# Altium footprint library hphonglib.PcbLib: 703 footprints (part 24 of 44)
Each footprint in its own frame and in the unit in brackets; x right, y up, seen from the top. Pads: shape width x height; smd on the part's side, far side on the other; paste and mask are expansions set on the pad; w line width, h text height; cw(c..) or ccw(c..) is an arc to the next point about the centre after c.
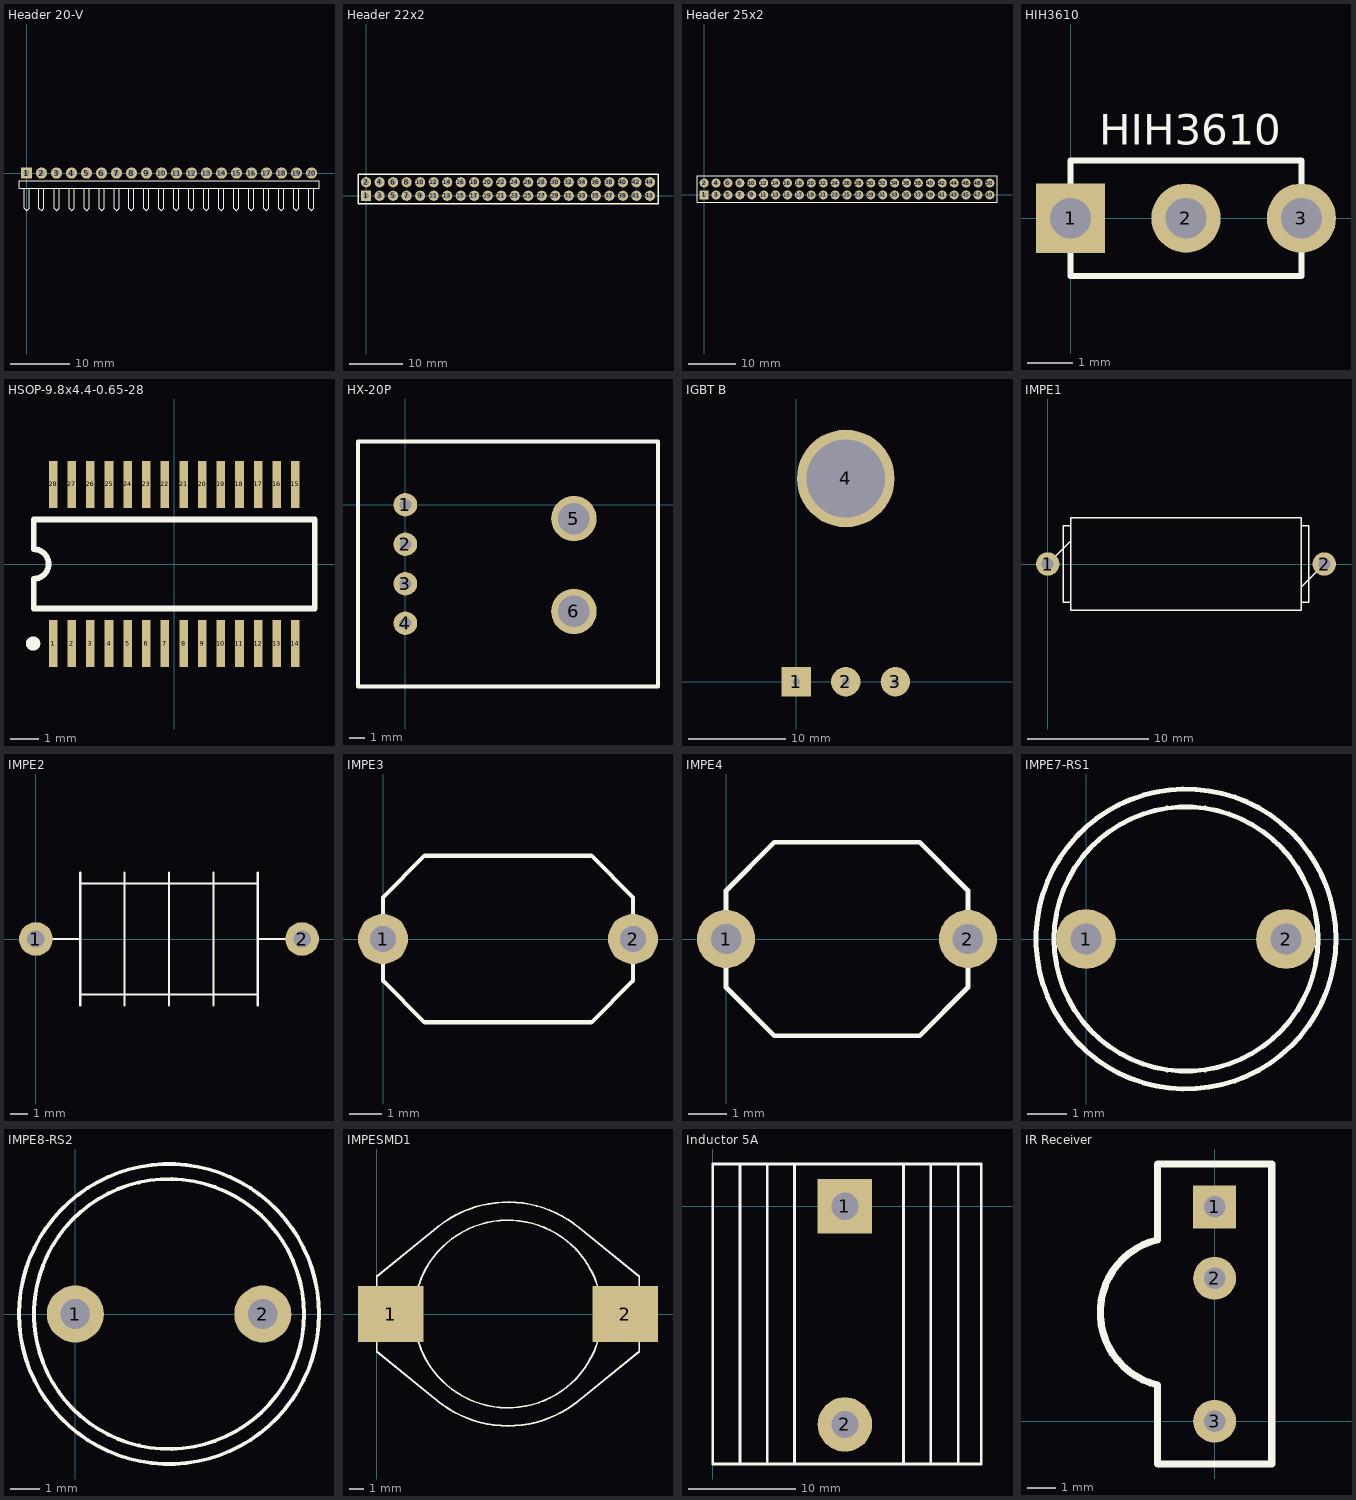
[diagram p23: the footprints below, top view; thin cyan lines are the x and y axes]

## Header 20-V [mil] "Connector; Header; 20 Position; Vertical; Solder Pad 35mil"
pads (20):
  rect 75x75 hole 40: 1(0,0)
  round 75 hole 40: 2(100,0) 3(200,0) 4(300,0) 5(400,0) 6(500,0) 7(600,0) 8(700,0) 9(800,0) 10(900,0) 11(1000,0) 12(1100,0) 13(1200,0) 14(1300,0) 15(1400,0) 16(1500,0) 17(1600,0) 18(1700,0) 19(1800,0) 20(1900,0)
Top Overlay:
  lines w7.87: -16.67,-100 -16.67,-233.33 0,-250 16.67,-233.33 16.67,-100 ; 83.33,-100 83.33,-233.33 100,-250 116.67,-233.33 116.67,-100 ; 183.33,-100 183.33,-233.33 200,-250 216.67,-233.33 216.67,-100 ; 283.33,-100 283.33,-233.33 300,-250 316.67,-233.33 316.67,-100 ; 383.33,-100 383.33,-233.33 400,-250 416.67,-233.33 416.67,-100 ; 483.33,-100 483.33,-233.33 500,-250 516.67,-233.33 516.67,-100 ; 583.33,-100 583.33,-233.33 600,-250 616.67,-233.33 616.67,-100 ; 683.33,-100 683.33,-233.33 700,-250 716.66,-233.33 716.66,-100 ; 783.33,-100 783.33,-233.33 800,-250 816.66,-233.33 816.66,-100 ; 883.33,-100 883.33,-233.33 900,-250 916.66,-233.33 916.66,-100 ; 983.33,-100 983.33,-233.33 1000,-250 1016.66,-233.33 1016.66,-100 ; 1083.33,-100 1083.33,-233.33 1100,-250 1116.66,-233.33 1116.66,-100 ; 1183.33,-100 1183.33,-233.33 1200,-250 1216.66,-233.33 1216.66,-100 ; 1283.33,-100 1283.33,-233.33 1300,-250 1316.66,-233.33 1316.66,-100 ; 1383.33,-100 1383.33,-233.33 1400,-250 1416.66,-233.33 1416.66,-100 ; 1483.33,-99.99 1483.33,-233.33 1499.99,-249.99 1516.66,-233.33 1516.66,-99.99 ; 1583.33,-99.99 1583.33,-233.33 1599.99,-249.99 1616.66,-233.33 1616.66,-99.99 ; 1683.33,-99.99 1683.33,-233.33 1699.99,-249.99 1716.66,-233.33 1716.66,-99.99 ; 1783.33,-99.99 1783.33,-233.33 1799.99,-249.99 1816.66,-233.33 1816.66,-99.99 ; 1883.33,-99.99 1883.33,-233.33 1899.99,-249.99 1916.66,-233.33 1916.66,-99.99 ; -50,-100 -50,-50 1950,-50 1950,-100 -50,-100
3D body: height 171.28, standoff -117.11, extent -50,-275.59 1950,50

## Header 22x2 [mil] "Connector; Header; 44 Position; 2 Rows; Solder Pad 35mil"
pads (44):
  rect 75x75 hole 40: 1(0,0)
  round 75 hole 40: 2(0,100) 3(100,0) 4(100,100) 5(200,0) 6(200,100) 7(300,0) 8(300,100) 9(400,0) 10(400,100) 11(500,0) 12(500,100) 13(600,0) 14(600,100) 15(700,0) 16(700,100) 17(800,0) 18(800,100) 19(900,0) 20(900,100) 21(1000,0) 22(1000,100) 23(1100,0) 24(1100,100) 25(1200,0) 26(1200,100) 27(1300,0) 28(1300,100) 29(1400,0) 30(1400,100) 31(1500,0) 32(1500,100) 33(1600,0) 34(1600,100) 35(1700,0) 36(1700,100) 37(1800,0) 38(1800,100) 39(1900,0) 40(1900,100) 41(2000,0) 42(2000,100) 43(2100,0) 44(2100,100)
Top Overlay:
  lines w10: -60,-60 -60,160 2160,160 2160,-60 -60,-60
3D body: height 330, standoff -100, extent -49.99,-49.99 2150.01,150.01

## Header 25x2 [mil] "Connector; Header; 50 Position; 2 Rows; Solder Pad 35mil"
pads (50):
  rect 75x75 hole 40: 1(0,0)
  round 75 hole 40: 2(0,100) 3(100,0) 4(100,100) 5(200,0) 6(200,100) 7(300,0) 8(300,100) 9(400,0) 10(400,100) 11(500,0) 12(500,100) 13(600,0) 14(600,100) 15(700,0) 16(700,100) 17(800,0) 18(800,100) 19(900,0) 20(900,100) 21(1000,0) 22(1000,100) 23(1100,0) 24(1100,100) 25(1200,0) 26(1200,100) 27(1300,0) 28(1300,100) 29(1400,0) 30(1400,100) 31(1500,0) 32(1500,100) 33(1600,0) 34(1600,100) 35(1700,0) 36(1700,100) 37(1800,0) 38(1800,100) 39(1900,0) 40(1900,100) 41(2000,0) 42(2000,100) 43(2100,0) 44(2100,100) 45(2200,0) 46(2200,100) 47(2300,0) 48(2300,100) 49(2400,0) 50(2400,100)
Top Overlay:
  lines w10: -60,-60 2460,-60 2460,160 -60,160 -60,-60
3D body: height 330, standoff -100, extent -50,-50 2450,150

## HIH3610 [mil]
pads (3):
  rect 60x60 hole 35.43: 1(0,0)
  round 60 hole 35.43: 2(100,0) 3(200,0)
Top Overlay:
  lines w5: 0,-50 200,-50 200,50 0,50 0,-50
  text "HIH3610" at 25,55 h45.6

## HSOP-9.8x4.4-0.65-28 [mm] "Small Outline Pakage; 28 Leads; Body 4.4 mm; Pitch 0.65 mm; Heatsink"
height 1.2
pads (28):
  rect 0.3x1.65 smd: 1(-4.225,-2.775) 2(-3.575,-2.775) 3(-2.925,-2.775) 4(-2.275,-2.775) 5(-1.625,-2.775) 6(-0.975,-2.775) 7(-0.325,-2.775) 8(0.325,-2.775) 9(0.975,-2.775) 10(1.625,-2.775) 11(2.275,-2.775) 12(2.925,-2.775) 13(3.575,-2.775) 14(4.225,-2.775) 15(4.225,2.775) 16(3.575,2.775) 17(2.925,2.775) 18(2.275,2.775) 19(1.625,2.775) 20(0.975,2.775) 21(0.325,2.775) 22(-0.325,2.775) 23(-0.975,2.775) 24(-1.625,2.775) 25(-2.275,2.775) 26(-2.925,2.775) 27(-3.575,2.775) 28(-4.225,2.775)
Top Overlay:
  circle w0.25: c-4.925,-2.775 r0.125
  lines w0.2: -4.9,-1.55 -4.9,-0.517 ccw(c-4.9,0) -4.9,0.517 -4.9,1.55 4.9,1.55 4.9,-1.55 -4.9,-1.55
3D body: height 1.35, standoff 0, extent -4.9,-3.228 4.9,3.228

## HX-20P [mil] "Current Transducer HX Series; 3-25A"
pads (6):
  round 60 hole 30: 1(0,0) 2(0,-100) 3(0,-200) 4(0,-300)
  round 115 hole 80: 5(427,-35) 6(427,-270)
Top Overlay:
  lines w10: -120,-460 -120,160 640,160 640,-460 -120,-460
3D body: height 473.44, standoff -195.85, extent -86.96,-464.96 542.96,164.96

## IGBT B [mm] "GT60N321"
pads (4):
  rect 3x3 hole 0.762: 1(0,0)
  round 3 hole 0.762: 2(5.08,0) 3(10.16,0)
  round 10 hole 8: 4(5.08,20.828)
Bottom Overlay:
  lines w0.2: -5.842,-3.302 16.256,-3.302 16.256,27.432 -5.842,27.432 -5.842,-3.302
  text "IGBT" at 0,8.636 h3
3D body: height 1.1, standoff -10.9, extent -2.616,-0.508 13.284,26.474
3D body: height 0, standoff 0, extent 16.61,-3.402 16.61,-3.402

## IMPE1 [mil] "Body 23x10 mm Horiz. - 900 mils"
pads (2):
  round 76 hole 39.37: 1(0,0) 2(900,0)
Top Overlay:
  lines w5: 0,0 75,75 ; 75,-125 50,-125 50,125 75,125 ; 825,-125 850,-125 850,125 825,125 ; 825,-75 900,0 ; 75,-150 75,150 825,150 825,-150 75,-150

## IMPE2 [mil] "Body 10x7.5 mm Horiz. - 600 mils"
pads (2):
  round 76 hole 39.37: 1(0,0) 2(600,0)
Top Overlay:
  lines w5: 0,0 100,0 ; 100,-150 100,150 ; 100,-125 500,-125 ; 100,125 500,125 ; 200,-150 200,150 ; 300,-150 300,150 ; 400,-150 400,150 ; 500,-150 500,150 ; 500,0 575,0

## IMPE3 [mil] "Body 7.6x4.9 mm Radial - 300 mils"
pads (2):
  round 60 hole 31.49 unplated: 1(0,0) 2(300,0)
Top Overlay:
  lines w5: 0,-50 0,50 50,100 250,100 300,50 300,-50 250,-100 50,-100 0,-50

## IMPE4 [mil] "Body 7.6x5.5 mm Radial - 250 mils"
pads (2):
  round 60 hole 31.49: 1(0,0) 2(250,0)
Top Overlay:
  lines w5: 0,-50 50,-100 200,-100 250,-50 250,50 200,100 50,100 0,50 0,-50

## IMPE7-RS1 [mil] "Body round radial diam 7.5mm - hight 9.5mm"
pads (2):
  round 60 hole 31.49: 1(0,0) 2(200,0)
Top Overlay:
  circle w5: c100,0 r150
  circle w5: c100,0 r132.1
3D body: height 208.66, standoff 0, extent -52,-156 255.09,151.09

## IMPE8-RS2 [mil] "Body round radial diam 10mm - hight 18mm"
pads (2):
  round 76 hole 39.37: 1(0,0) 2(250,0)
Top Overlay:
  circle w5: c125,0 r200
  circle w5: c125,0 r180
3D body: height 208.66, standoff 0, extent -28.54,-152 278.54,155.09

## IMPESMD1 [mil]
pads (2):
  rect 175x150 smd: 1(37.5,0) 2(662.5,0)
Top Overlay:
  circle w5: c350,0 r250.19
  lines w5: 150.38,221.7 cw(c350,0) 540.16,229.87 ; 160,-230 0,-100 0,100 160,230 ; 160.24,-230.2 ccw(c350,0) 540.16,-229.87 ; 540,-230 700,-100 700,100 540,230
3D body: height 110, standoff 0, extent 206,-90 466,90

## Inductor 5A [mil] "Inductor 5A; Solder Pad 35mil"
pads (2):
  rect 200x200 hole 100: 1(485,0)
  round 200 hole 100: 2(485,-800)
Top Overlay:
  lines w10: 100,-945 100,155 ; 200,-935 200,155 ; 300,-945 300,155 ; 700,-945 700,155 ; 800,-940 800,155 ; 900,-945 900,155 ; 0,-945 985,-945 985,155 0,155 0,-945

## IR Receiver [mil] "IR Receiver"
pads (3):
  rect 60x60 hole 30: 1(0,300)
  round 60 hole 30: 2(0,200) 3(0,0)
Top Overlay:
  lines w10: -80,49.4 -80,-60 80,-60 80,360 -80,360 -80,255.11 ; -79.73,50.52 cw(c-55.42,152.26) -79.73,254
3D body: height 334.65, standoff 78.74, extent -160,50 -80,255
3D body: height 472.44, standoff 78.74, extent -80.2,-60.2 80,360.2